# Altium footprint library AltiumLibrary.PcbLib: 120 footprints (part 5 of 8)
Each footprint in its own frame and in the unit in brackets; x right, y up, seen from the top. Pads: shape width x height; smd on the part's side, far side on the other; paste and mask are expansions set on the pad; w line width, h text height; cw(c..) or ccw(c..) is an arc to the next point about the centre after c.
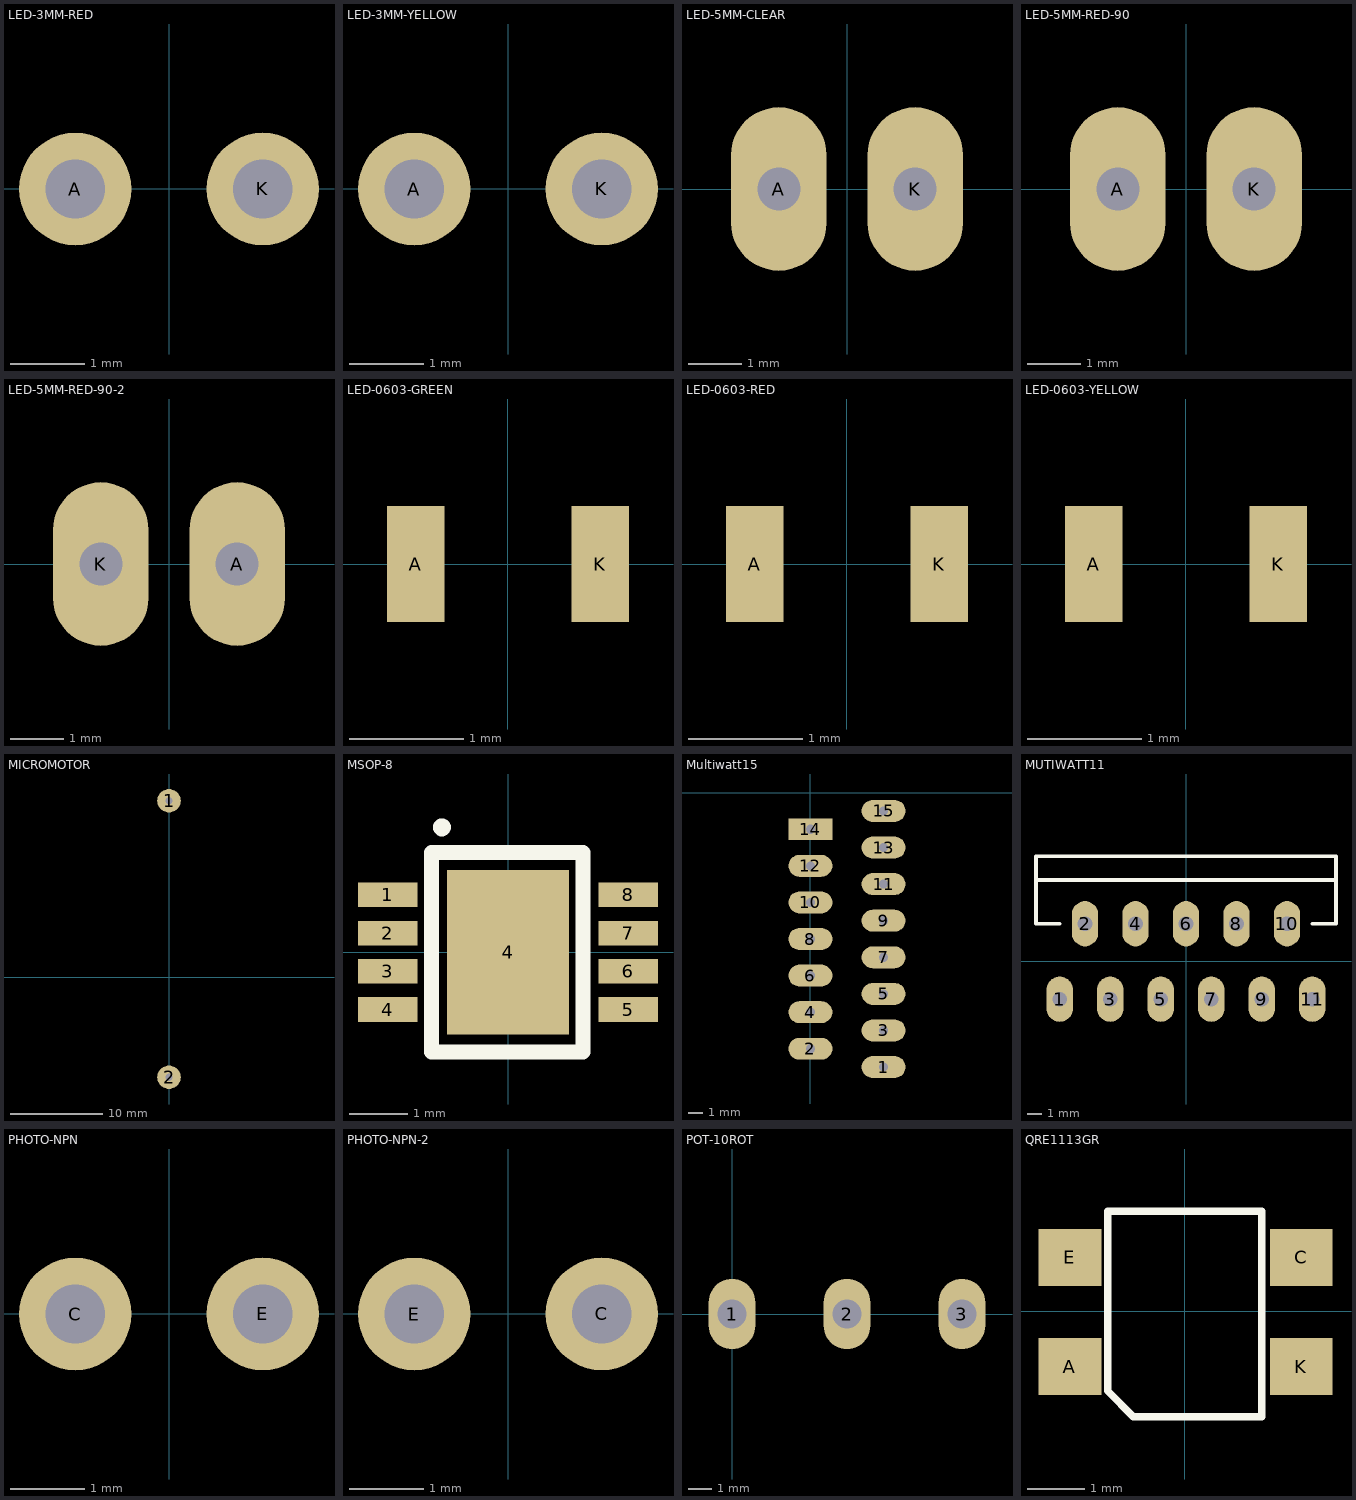
[diagram p4: the footprints below, top view; thin cyan lines are the x and y axes]

## LED-3MM-RED [mil]
pads (2):
  round 60 hole 31.5: A(-50,0) K(50,0)
3D body "SW3dPS-LEDd3R.STEP": height 217.04, standoff -97.93, extent -65.51,-65.13 64.41,64.8

## LED-3MM-YELLOW [mil]
pads (2):
  round 60 hole 31.5: A(-50,0) K(50,0)
3D body "SW3dPS-LEDd3Y.STEP": height 217.04, standoff -97.93, extent -65.51,-65.13 64.41,64.8

## LED-5MM-CLEAR [mil]
pads (2):
  oval 70x120 hole 31.5: A(-50,0) K(50,0)
3D body "LED 5mm.STEP": height 346.46, standoff -1062.99, extent -118.11,-118.1 98.42,118.1

## LED-5MM-RED-90 [mil]
pads (2):
  oval 70x120 hole 31.5: A(-50,0) K(50,0)
3D body "LED 5mm, Red, Thru-hole, Right Angle PCB 2.stp": height 234.07, standoff -125.98, extent -116.14,-421.26 96.46,9.85

## LED-5MM-RED-90-2 [mil]
pads (2):
  oval 70x120 hole 31.5: A(50,0) K(-50,0)
3D body "LED 5mm, Red, Thru-hole, Right Angle PCB 1.stp": height 234.08, standoff -125.98, extent -96.45,-421.26 116.14,9.85

## LED-0603-GREEN [mil]
pads (2):
  rect 20x40 smd: A(-31.89,0) K(31.89,0)
3D body "User Library-led0603_GRE.step": height 43.31, standoff 0, extent -31.89,-15.74 31.89,15.75

## LED-0603-RED [mil]
pads (2):
  rect 20x40 smd: A(-31.89,0) K(31.89,0)
3D body "User Library-led0603_RED.step": height 43.31, standoff 0, extent -31.89,-15.74 31.89,15.75

## LED-0603-YELLOW [mil]
pads (2):
  rect 20x40 smd: A(-31.89,0) K(31.89,0)
3D body "User Library-led0603_YEL.step": height 43.31, standoff 0, extent -31.89,-15.74 31.89,15.75

## MICROMOTOR [mm]
pads (2):
  round 2.54 hole 0.8: 1(0,19.05) 2(0,-10.795)
3D body "User Library-MOTOR, POLOLU.step": height 9.95, standoff -0.05, extent -0.762,-2.094 34.008,9.906
3D body "User Library-Pololu Extended Micro Metal Bracket.step": height 11.5, standoff 0, extent 7.366,-9.525 24.666,17.075

## MSOP-8 [mil]
pads (9):
  rect 40x16.5 smd: 1(-80.5,38.4) 2(-80.5,12.8) 3(-80.5,-12.8) 4(-80.5,-38.4) 5(80.5,-38.4) 6(80.5,-12.8) 7(80.5,12.8) 8(80.5,38.4)
  rect 82x110 smd: 4(0,0)
Top Overlay:
  circle w10: c-44.29,83.66 r0.98
  lines w10: -51.18,-66.93 50.2,-66.93 50.2,66.93 -51.18,66.93 -51.18,-66.93
3D body "MSOP-8_MSE-M.step": height 43.11, standoff 0, extent -99.48,-60.98 99.49,60.99

## Multiwatt15 [mil]
pads (15):
  oval 120x60 hole 25: 1(200,-750) 2(0,-700) 3(200,-650) 4(0,-600) 5(200,-550) 6(0,-500) 7(200,-450) 8(0,-400) 9(200,-350) 10(0,-300) 11(200,-250) 12(0,-200) 13(200,-150) 15(200,-50)
  rect 120x60 hole 25: 14(0,-100)
3D body "User Library-Multiwatt15V.STEP": height 831.1, standoff -46.85, extent -175,-785.83 214.37,-14.17

## MUTIWATT11 [mil]
pads (11):
  oval 70x120 hole 39.37: 1(-334.65,-100) 2(-267.72,100) 3(-200.79,-100) 4(-133.86,100) 5(-66.93,-100) 6(0,100) 7(66.93,-100) 8(133.86,100) 9(200.79,-100) 10(267.72,100) 11(334.65,-100)
Top Overlay:
  lines w10: -397.64,216.14 397.64,216.14 ; -334.65,100 -397.64,100 -397.64,279.13 397.64,279.13 397.64,100 334.65,100
3D body "User Library-Multiwatt11V.step": height 858.27, standoff -125.98, extent -397.64,-113.78 397.64,275.59

## PHOTO-NPN [mil]
pads (2):
  round 60 hole 31.5: C(-50,0) E(50,0)
3D body "LED 3mm, Red, Thru-hole, Right Angle PCB 1.stp": height 154.51, standoff -125.98, extent -75.78,-9.84 64.77,287.4

## PHOTO-NPN-2 [mil]
pads (2):
  round 60 hole 31.5: C(50,0) E(-50,0)
3D body "LED 3mm, Red, Thru-hole, Right Angle PCB 2.stp": height 154.51, standoff -125.98, extent -64.77,-8.59 75.79,288.66

## POT-10ROT [mil]
pads (3):
  oval 80x120 hole 49.21: 1(0,0) 2(196.85,0) 3(393.7,0)
3D body "B10K potentiometer 10K.stp": height 828.74, standoff -137.8, extent -137.59,-780.71 535.6,203.54

## QRE1113GR [mm]
pads (4):
  rect 1.1x1 smd: A(-2.01,-0.97) C(2.04,0.94) E(-2.01,0.94) K(2.04,-0.97)
Top Overlay:
  lines w0.127: -1.35,-1.4 -1.35,1.75 1.35,1.75 1.35,-1.85 -0.9,-1.85 -1.35,-1.4
Top Paste:
  region: -2.601,1.5 -1.4,1.5 -1.4,0.4 -2.601,0.4
  region: -2.605,-0.4 -1.4,-0.4 -1.4,-1.503 -2.605,-1.503
  region: 1.453,-0.4 2.65,-0.4 2.65,-1.503 1.453,-1.503
  region: 1.404,1.5 2.65,1.5 2.65,0.401 1.404,0.401
3D body "User Library-QRE1113GR.step": height 1.83, standoff -0.02, extent -2.4,-1.8 2.4,1.8